# Altium footprint library XU-GENARAL PCB .PcbLib: 1176 footprints (part 72 of 75)
Each footprint in its own frame and in the unit in brackets; x right, y up, seen from the top. Pads: shape width x height; smd on the part's side, far side on the other; paste and mask are expansions set on the pad; w line width, h text height; cw(c..) or ccw(c..) is an arc to the next point about the centre after c.
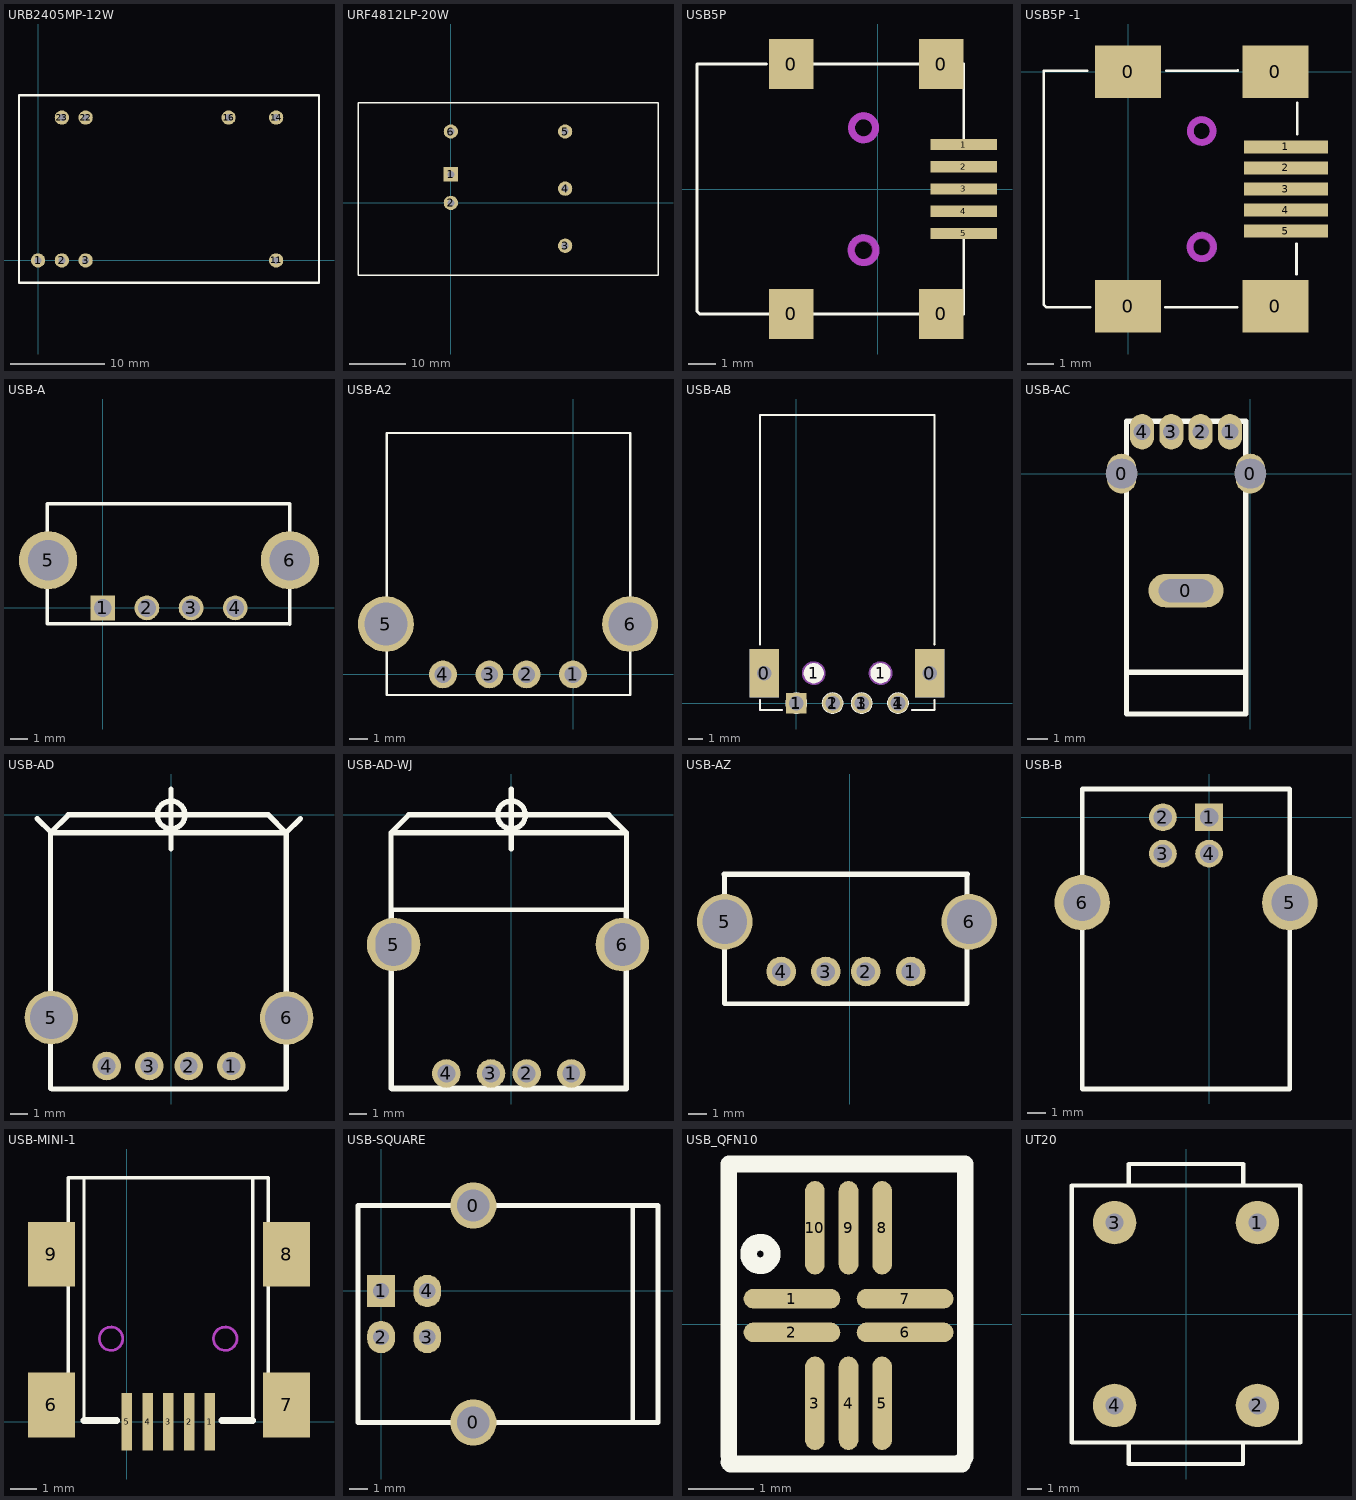
[diagram p71: the footprints below, top view; thin cyan lines are the x and y axes]

## URB2405MP-12W [mil]
pads (8):
  round 60 hole 30: 1(0,0) 2(100,0) 3(200,0) 11(1000,0) 14(1000,600) 16(800,600) 22(200,600) 23(100,600)
Top Overlay:
  lines w10: -79.92,-93.7 -79.92,693.7 1179.92,693.7 1179.92,-93.7 -79.92,-93.7

## URF4812LP-20W [mil]
pads (6):
  rect 100x100 hole 50: 1(0,200)
  round 100 hole 50: 2(0,0) 3(800,-300) 4(800,100) 5(800,500) 6(0,500)
Top Overlay:
  lines w10: -650,-505 1450,-505 1450,700 -650,700 -650,-505

## USB5P [mm]
pads (9):
  rect 1.6x1.8 smd: 0(-3.1,-4.5) 0(-3.1,4.5) 0(2.3,-4.5) 0(2.3,4.5)
  rect 2.4x0.4 smd: 1(3.1,1.6) 2(3.1,0.8) 3(3.1,0) 4(3.1,-0.8) 5(3.1,-1.6)
Top Overlay:
  lines w0.1: -4,4.5 -6.5,4.5 -6.5,-4.4 -6.4,-4.5 -3.9,-4.5 ; -2.3,-4.5 1.5,-4.5 ; -2.3,4.5 1.5,4.5 ; 3.1,-4.5 3.1,-1.8 ; 3.1,1.8 3.1,4.5
Keep-Out Layer:
  circle w0.254: c-0.508,-2.21 r0.432
  circle w0.254: c-0.508,2.21 r0.432
Mechanical 1:
  circle w0.254: c-0.5,-2.2 r0.451
  circle w0.254: c-0.5,2.2 r0.432

## USB5P -1 [mm]
pads (9):
  rect 2.5x2 smd: 0(0,-8.9) 0(0,0) 0(5.6,-8.9) 0(5.6,0)
  rect 3.2x0.5 smd: 1(6,-2.85) 2(6,-3.65) 3(6,-4.45) 4(6,-5.25) 5(6,-6.05)
Top Overlay:
  lines w0.1: -1.55,0.05 -3.2,0.05 -3.2,-8.85 -3.1,-8.95 -1.449,-8.95 ; 1.422,-8.95 4.14,-8.95 ; 1.447,0.05 4.166,0.051 ; 6.401,-7.696 6.401,-6.528 ; 6.426,-2.362 6.426,-1.168
Keep-Out Layer:
  circle w0.254: c2.792,-6.66 r0.432
  circle w0.254: c2.792,-2.24 r0.432
Mechanical 1:
  circle w0.254: c2.8,-6.65 r0.451
  circle w0.254: c2.8,-2.25 r0.432

## USB-A [mm]
pads (6):
  rect 1.397x1.397 hole 1: 1(0,0)
  round 1.397 hole 1: 2(2.5,0) 3(5,0) 4(7.5,0)
  round 3.3 hole 2.3: 5(-3.1,2.7) 6(10.6,2.7)
Top Overlay:
  lines w0.203: 10.591,-0.907 -3.151,-0.907 -3.151,5.893 10.591,5.893 ; 10.599,-0.914 10.599,5.886

## USB-A2 [mm]
pads (6):
  round 1.5 hole 0.92: 1(0,0) 2(-2.5,0) 3(-4.5,0) 4(-7,0)
  round 3 hole 2.3: 5(-10.07,2.71) 6(3.07,2.71)
Top Overlay:
  lines w0.127: -10.03,-1.11 -10.03,12.99 3.07,12.99 3.07,2.71 3.07,-1.11 -10.03,-1.11

## USB-AB [mm]
pads (42):
  rect 2x3.3 hole 1 square: 0(-2.199,2.06) 0(9.18,2.06)
  round 0.127 on Mech4: 1(-2.59,1.32) 1(-2.59,1.32) 1(-2.59,2.8) 1(-2.59,2.8) 1(-2.5,-0.47) 1(-2.5,-0.47) 1(-2.5,0.23) 1(-2.5,4.03) 1(-2.5,19.83) 1(-2.5,19.83) 1(-1.79,1.32) 1(-1.79,1.32) 1(-1.79,2.8) 1(-1.79,2.8) 1(-0.973,-0.47) 1(7.969,-0.47) 1(8.79,1.32) 1(8.79,1.32) 1(8.79,2.8) 1(8.79,2.8) 1(9.5,-0.47) 1(9.5,-0.47) 1(9.5,0.23) 1(9.5,4.03) 1(9.5,19.83) 1(9.5,19.83) 1(9.59,1.32) 1(9.59,1.32) 1(9.59,2.8) 1(9.59,2.8)
  rect 1.397x1.397 hole 1: 1(0,0)
  round 1.5 on Top Overlay: 1(0,0) 1(2.5,0) 1(4.5,0) 1(7,0)
  round 1.4 on Top Overlay: 1(1.2,2.06) 1(5.8,2.06)
  round 1.397 hole 1: 2(2.5,0) 3(4.5,0) 4(7,0)
Top Overlay:
  region: -3.19,3.71 -1.19,3.71 -1.19,0.41 -3.19,0.41
  region: 8.19,3.71 10.19,3.71 10.19,0.41 8.19,0.41
  lines w0.127: -2.5,0.23 -2.5,-0.47 -0.973,-0.47 ; -2.5,4.03 -2.5,19.83 9.5,19.83 9.5,4.03 ; 7.969,-0.47 9.5,-0.47 9.5,0.23
Mechanical 1:
  circle w0.254: c1.2,2.06 r0.692
  circle w0.254: c5.8,2.06 r0.692
  lines w0.127: -2.59,1.32 ccw(c-2.19,1.32) -1.79,1.32 -1.79,2.8 ccw(c-2.19,2.8) -2.59,2.8 -2.59,1.32 ; 8.79,1.32 ccw(c9.19,1.32) 9.59,1.32 9.59,2.8 ccw(c9.19,2.8) 8.79,2.8 8.79,1.32

## USB-AC [mm]
pads (7):
  oval 1.4x1.9 hole 1.4 slot 1.5 at 0 deg: 0(-6.16,0) 0(0,0)
  oval 3.6x1.6 hole 1.1 slot 2.6 at 0 deg: 0(-3.08,-5.6)
  oval 1.15x1.7 hole 0.8: 1(-0.98,2) 2(-2.38,2) 3(-3.78,2) 4(-5.18,2)
Top Overlay:
  circle w0.254: c-2.379,2 r0.4
  circle w0.254: c-5.179,2 r0.4
  circle w0.254: c-3.779,2 r0.4
  circle w0.254: c-0.979,2 r0.4
  lines w0.254: -5.929,-9.5 -0.229,-9.5 ; -5.929,-11.5 -0.229,-11.5 -0.229,2.5 -5.929,2.5 -5.929,-11.5
Mechanical 1:
  lines w0.254: -3.779,-6.05 cw(c-3.779,-5.6) -3.779,-5.15 -2.379,-5.15 cw(c-2.379,-5.6) -2.379,-6.05 -3.779,-6.05

## USB-AD [mm]
pads (6):
  round 1.6 / inner oval 1.7x2 / far side oval 1.7x2 hole 1: 1(3.378,-14.072) 2(0.991,-14.072) 3(-1.219,-14.072) 4(-3.607,-14.072)
  round 3 / inner round 3.5 / far side round 3.5 hole 2.4: 5(-6.706,-11.354) 6(6.477,-11.379)
Top Overlay:
  circle w0.3: c0,0 r0.778
  lines w0.254: -6.696,-15.359 6.454,-15.359
  lines w0.3: -7.5,-0.2 -6.7,-1 ; -6.75,-15.324 -6.75,-1 ; 0,-1.9 0,1.45 ; 6.45,-15.324 6.45,-1 ; 7.25,-0.2 6.45,-1 ; -6.75,-1 6.45,-1 ; -6.75,-1 -5.75,0 5.45,0 6.45,-1

## USB-AD-WJ [mm]
pads (6):
  round 1.6 / inner oval 1.7x2 / far side oval 1.7x2 hole 1: 1(3.356,-14.49) 2(0.856,-14.49) 3(-1.144,-14.49) 4(-3.644,-14.49)
  round 3 / inner round 3.5 / far side round 3.5 hole 2 slot 2.4 at 90 deg: 5(-6.604,-7.264) 6(6.223,-7.264)
Top Overlay:
  circle w0.3: c0,0 r0.778
  lines w0.254: -6.696,-15.359 6.454,-15.359 ; -6.694,-5.29 -6.694,-15.29 6.406,-15.29 6.406,-5.29 ; -6.655,-5.309 6.299,-5.309
  lines w0.3: -6.75,-15.324 -6.75,-1 ; 0,-1.9 0,1.45 ; 6.45,-15.324 6.45,-1 ; -6.75,-1 6.45,-1 ; -6.75,-1 -5.75,0 5.45,0 6.45,-1
Mechanical 1:
  circle w0.254: c-3.644,-14.49 r0.46
  circle w0.254: c-1.144,-14.49 r0.46
  circle w0.254: c0.856,-14.49 r0.46
  circle w0.254: c3.356,-14.49 r0.46
  lines w0.254: -6.844,-7.665 ccw(c-6.544,-7.665) -6.694,-7.925 ccw(c-6.544,-7.665) -6.244,-7.665 -6.244,-6.815 ccw(c-6.544,-6.815) -6.694,-6.555 ccw(c-6.544,-6.815) -6.844,-6.815 -6.844,-7.665 ; 5.956,-7.665 ccw(c6.256,-7.665) 6.406,-7.925 ccw(c6.256,-7.665) 6.556,-7.665 6.556,-6.815 ccw(c6.256,-6.815) 6.406,-6.555 ccw(c6.256,-6.815) 5.956,-6.815 5.956,-7.665

## USB-AZ [mm]
pads (6):
  round 1.6 / inner oval 1.7x2 / far side oval 1.7x2 hole 1: 1(3.302,-13.691) 2(0.864,-13.691) 3(-1.295,-13.691) 4(-3.708,-13.691)
  round 3 / inner round 3.5 / far side round 3.5 hole 2.4: 5(-6.75,-11) 6(6.45,-11)
Top Overlay:
  lines w0.254: -6.766,-8.458 -6.766,-15.435 6.334,-15.435 6.334,-8.458
  lines w0.3: -6.783,-8.432 6.35,-8.432

## USB-B [mil]
pads (6):
  rect 60x60 hole 40: 1(0,0)
  round 60 hole 40: 2(-100,0) 3(-100,-78.74) 4(0,-78.74)
  round 120 hole 80: 5(175,-185.04) 6(-275,-185.04)
Top Overlay:
  lines w10: -275,-588.74 175,-588.74 175,61.26 -275,61.26 -275,-588.74

## USB-MINI-1 [mm]
pads (9):
  rect 0.4x2.2 smd: 1(3.2,0) 2(2.4,0) 3(1.6,0) 4(0.8,0) 5(0,0)
  rect 1.8x2.5 smd: 6(-2.9,0.65) 7(6.15,0.65) 8(6.15,6.45) 9(-2.9,6.45)
Top Overlay:
  lines w0.127: -2.25,1.4 -3.35,1.4 -3.35,1.15 cw(c-3.35,0.65) -3.35,0.15 -3.35,-0.1 -2.25,-0.1 -2.25,9.4 5.45,9.4 5.45,-0.1 6.55,-0.1 6.55,0.15 cw(c6.55,0.65) 6.55,1.15 6.55,1.4 5.45,1.4 ; -2.25,5.7 -3.35,5.7 -3.35,5.95 ccw(c-3.35,6.45) -3.35,6.95 -3.35,7.2 -2.25,7.2 ; -1.65,0.05 -1.65,9.4 ; 4.85,0.05 4.85,9.4 ; 5.45,5.7 6.55,5.7 6.55,5.95 cw(c6.55,6.45) 6.55,6.95 6.55,7.2 5.45,7.2
  lines w0.254: -1.65,0.05 -0.382,0.05 ; 3.657,0.05 4.85,0.05
Keep-Out Layer:
  circle w0.1: c-0.6,3.2 r0.45
  circle w0.1: c3.8,3.2 r0.45
Mechanical 1:
  circle w0.1: c-0.61,3.2 r0.45
  circle w0.1: c3.785,3.2 r0.45

## USB-SQUARE [mil]
height 68.9
pads (6):
  round 100 hole 70: 0(200,-285) 0(200,185)
  rect 60x70 hole 35: 1(0,0)
  oval 60x70 hole 35: 2(0,-100) 3(100,-100) 4(100,0)
Top Overlay:
  lines w10: 170,-285 -50,-285 -50,185 170,185 ; 225,185 600,185 600,-285 230,-285 ; 545,-285 545,185

## USB_QFN10 [mm]
pads (10):
  oval 1.475x0.3 smd: 1(2.717,0.386) 2(2.717,-0.127) 6(4.442,-0.127) 7(4.442,0.386)
  oval 0.3x1.425 smd: 3(3.067,-1.208) 4(3.58,-1.208) 5(4.092,-1.208) 8(4.092,1.467) 9(3.58,1.467) 10(3.067,1.467)
Top Overlay:
  circle w0.254: c2.235,1.067 r0.18
  lines w0.254: 1.753,-2.108 1.778,-2.134 5.309,-2.134 5.258,-2.134 5.359,-2.032 5.359,2.438 1.753,2.438 1.753,-2.007

## UT20 [mil]
pads (4):
  round 120 hole 50: 1(196.85,251.97) 2(196.85,-251.97) 3(-196.85,251.97) 4(-196.85,-251.97)
Top Overlay:
  lines w12: -158,-354.33 -158,-413.39 156.96,-413.39 156.96,-354.33 ; -157.48,354.33 -157.48,413.39 157.48,413.39 157.48,354.33 ; -314.96,-354.33 314.96,-354.33 314.96,354.33 -314.96,354.33 -314.96,-354.33